# Altium schematic symbol library altera.SCHLIB: 68 symbols (part 4 of 6) (continued)
## EPF10K130V-P240 (continued)
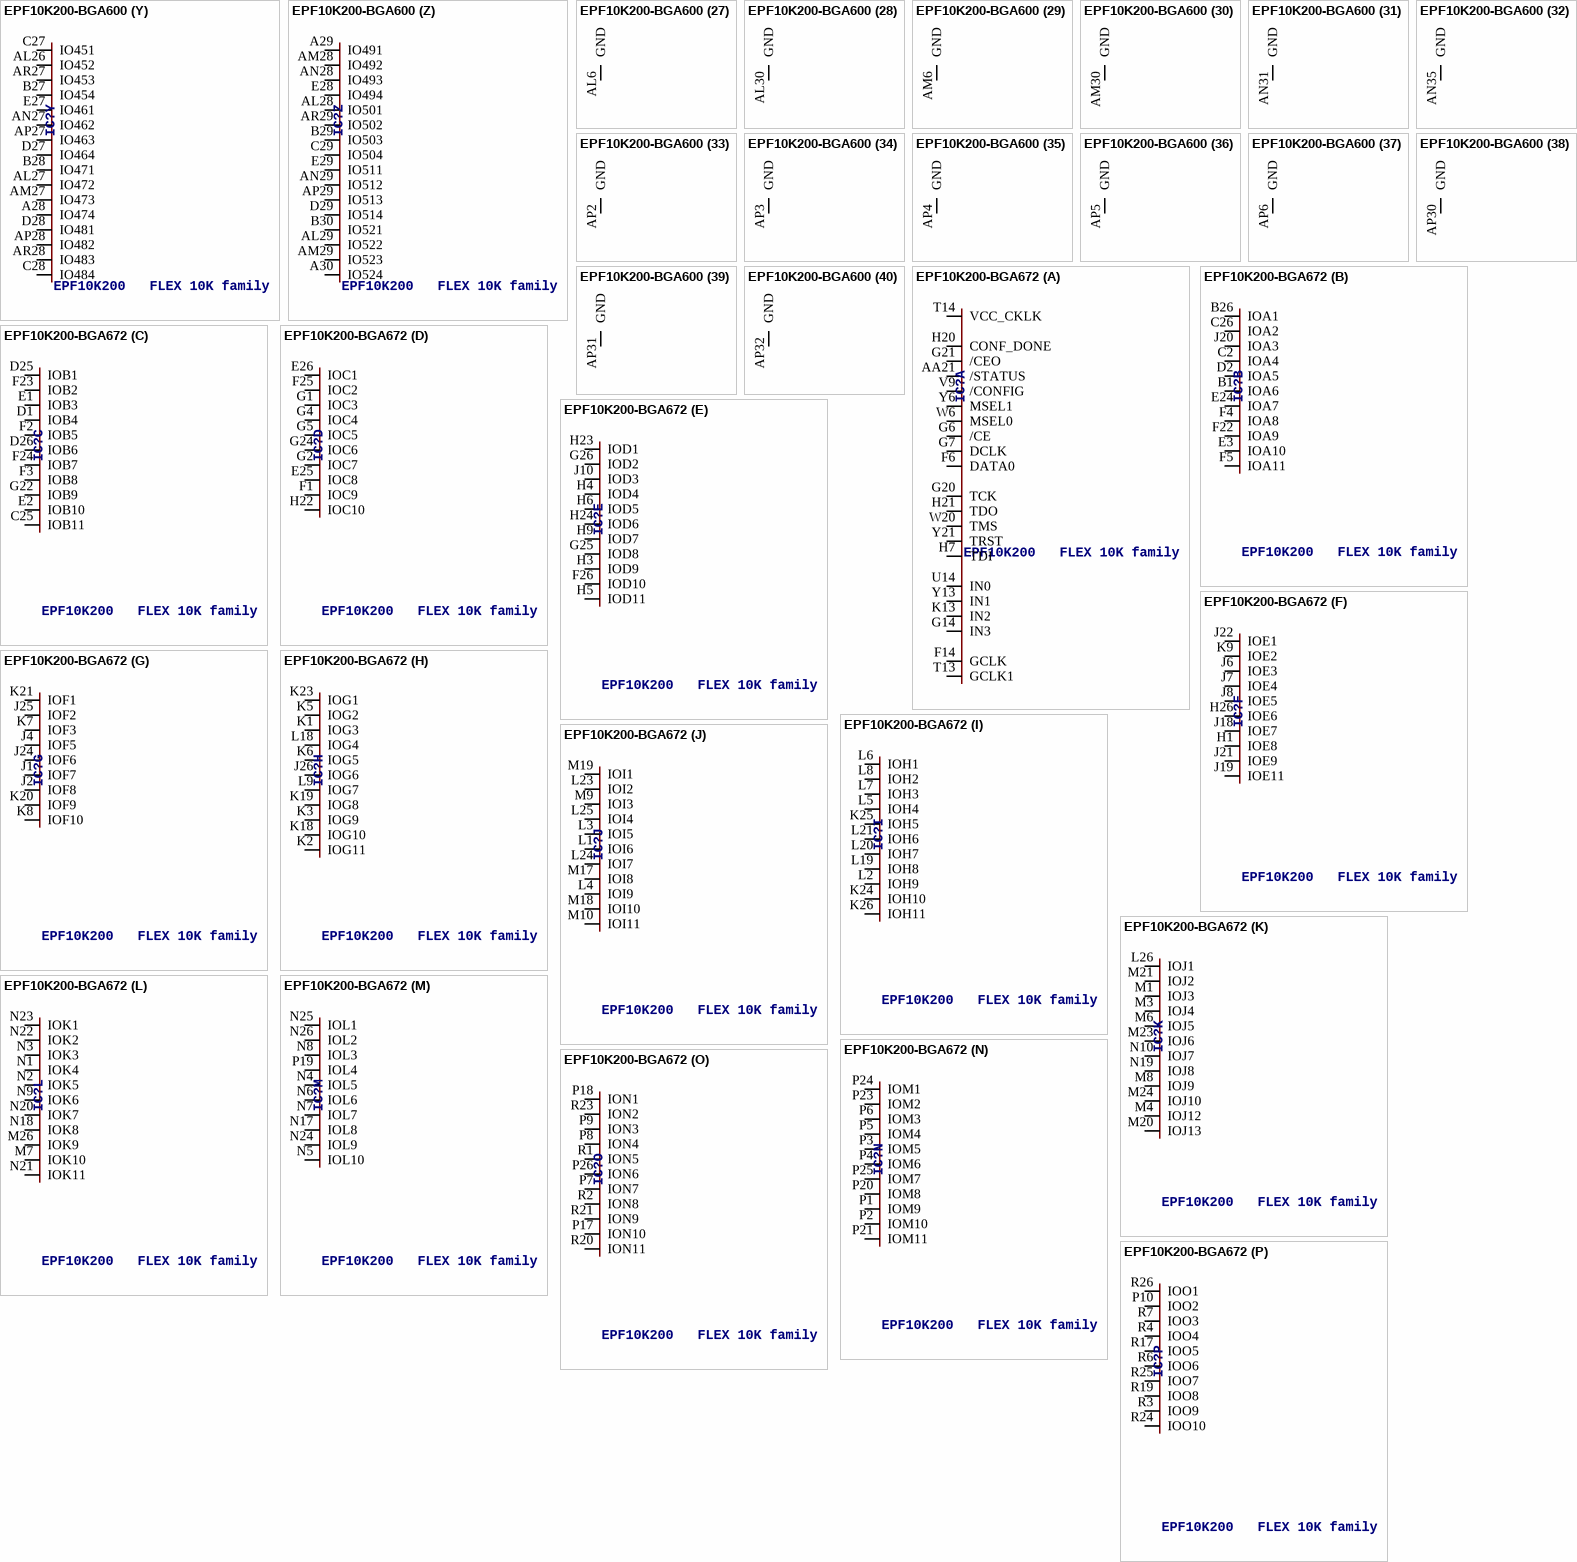
[diagram p30: symbols EPF10K200-BGA600 to EPF10K200-BGA672]

## EPF10K200-BGA600
designator IC?, comment EPF10K200   FLEX 10K family
MPN: EPF10K200EBC600-1; OC_FARNELL: unknown; OC_NEWARK: 51R8896
footprint BGA600
part A pins: AL18 GCLK, AL31 TCK, AM4 DATA0, AM18 IN3, AM32 CONF_DONE, AN1 TDI, AN2 /CE, AN18 IN2, AN34 TDO, AP1 DCLK, AP35 /CEO, C1 MSEL1, C18 IN1, C34 TRST, C35 TMS, D4 /CONFIG, D18 IN0, D32 /STATUS, E18 GCLK1, F5 MSEL0, P5 VCC_CKLK
part B pins: AJ4 IOB5, AJ5 IOA8, AJ31 IOA7, AJ32 IOB7, AK3 IOB10, AK4 IOB4, AK5 IOA4, AK32 IOB1, AK33 IOB9, AL1 IOB3, AL2 IOB8, AL4 IOA10, AL32 IOA1, AL33 IOB2, AL34 IOB11, AL35 IOB6, AM1 IOA5, AM2 IOA11, AM3 IOA6, AM33 IOA2, AM34 IOA3, AM35 IOA9
part C pins: AG4 IOD9, AG31 IOD10, AH1 IOD3, AH2 IOD4, AH3 IOD5, AH4 IOD11, AH5 IOC9, AH31 IOC8, AH32 IOD8, AH33 IOD6, AH34 IOD1, AH35 IOD2, AJ1 IOD7, AJ2 IOC3, AJ3 IOC5, AJ33 IOC2, AJ34 IOC6, AJ35 IOC10, AK1 IOC7, AK2 IOC4, AK34 IOC1
part D pins: AE3 IOF7, AE5 IOF3, AE31 IOF2, AE32 IOF4, AE33 IOF6, AF1 IOF8, AF2 IOF5, AF3 IOF10, AF4 IOE3, AF5 IOE4, AF31 IOE1, AF33 IOE7, AF34 IOF9, AF35 IOF1, AG1 IOE2, AG2 IOE5, AG3 IOE8, AG32 IOE6, AG33 IOE9, AG34 IOE11, AG35 IOE10
part E pins: AC2 IOH4, AC3 IOH9, AC4 IOH1, AC5 IOH2, AC31 IOH8, AC32 IOH10, AC33 IOH6, AC34 IOH11, AC35 IOH7, AD1 IOH3, AD2 IOG7, AD3 IOG3, AD4 IOG9, AD5 IOG2, AD31 IOG1, AD32 IOG8, AD33 IOG4, AD34 IOH5, AE1 IOG11, AE2 IOG5, AE34 IOG6, AE35 IOG10
part F pins: AA1 IOJ3, AA2 IOJ4, AA3 IOJ5, AA4 IOJ12, AA5 IOJ7, AA31 IOJ1, AA32 IOJ11, AA34 IOJ6, AA35 IOJ10, AB1 IOI6, AB2 IOI3, AB3 IOI9, AB4 IOI5, AB31 IOI10, AB32 IOI2, AB33 IOI7, AB34 IOI4, AB35 IOI8, AC1 IOI11, Y5 IOJ9, Y31 IOJ8
part G pins: V4 IOL3, V5 IOL6, V31 IOL2, V33 IOL4, W1 IOL5, W2 IOL7, W3 IOL10, W4 IOK3, W5 IOK4, W31 IOK9, W32 IOK8, W33 IOL9, W34 IOL8, W35 IOL1, Y1 IOK5, Y3 IOK10, Y4 IOK6, Y32 IOK11, Y33 IOK7, Y34 IOK1, Y35 IOK2
part H pins: T2 ION8, T3 ION5, T4 ION3, T5 ION4, T31 ION6, T32 ION2, T33 ION11, T34 ION9, U1 ION7, U2 IOM4, U4 IOM6, U5 IOM3, U31 IOM2, U32 IOM8, U33 IOM7, U34 ION10, U35 ION1, V1 IOM5, V2 IOM9, V3 IOM10, V34 IOM11, V35 IOM1
part I pins: N5 IOP4, P1 IOP7, P2 IOP2, P3 IOP3, P4 IOP6, P31 IOP10, P32 IOP1, P33 IOP11, P34 IOP5, P35 IOP8, R1 IOP9, R2 IOO6, R3 IOO2, R4 IOO3, R5 IOO4, R31 IOO8, R32 IOO1, R33 IOO7, R34 IOO10, R35 IOO5, T1 IOO9
part J pins: L1 IOR8, L2 IOR4, L34 IOR3, L35 IOR2, M1 IOQ6, M3 IOR5, M4 IOR9, M5 IOR7, M31 IOQ7, M32 IOR6, M33 IOR10, M34 IOR1, M35 IOQ4, N1 IOQ2, N2 IOQ3, N3 IOQ9, N4 IOQ8, N31 IOQ10, N32 IOQ11, N33 IOQ5, N35 IOQ1
part K pins: J1 IOT3, J2 IOT4, J3 IOT7, J32 IOT8, J33 IOT5, J34 IOT1, J35 IOT11, K1 IOS5, K2 IOS8, K3 IOS4, K4 IOT9, K5 IOT2, K31 IOT6, K33 IOT10, K34 IOS2, K35 IOS1, L3 IOS9, L4 IOS3, L5 IOS7, L31 IOS6, L32 IOS10, L33 IOS11
part L pins: F1 IOV3, F2 IOV7, F34 IOV2, G1 IOV9, G2 IOV11, G3 IOV4, G33 IOV1, G34 IOV6, G35 IOV10, H2 IOU4, H3 IOU3, H4 IOU5, H5 IOV5, H31 IOV8, H32 IOU9, H33 IOU1, H34 IOU10, H35 IOU6, J4 IOU7, J5 IOU8, J31 IOU2
part M pins: D1 IOX9, D2 IOX4, D3 IOX3, D33 IOX10, D34 IOX7, D35 IOX2, E1 IOW3, E3 IOW2, E4 IOX5, E32 IOX6, E33 IOW4, E34 IOW10, E35 IOW6, F3 IOW5, F4 IOW7, F32 IOW8, F33 IOW11, G4 IOW9, G5 IOX8, G31 IOX1, G32 IOW1
part N pins: A6 IO14, A7 IO31, AL7 IO13, AL8 IO42, AM7 IO22, AM8 IO43, AN7 IO23, AP7 IO32, AR6 IO12, AR7 IO33, B7 IO34, C7 IO21, D7 IO24, D8 IO41, E7 IO11, E8 IO44
part O pins: A8 IO51, A9 IO82, AL9 IO63, AL10 IO83, AM9 IO62, AN9 IO73, AP8 IO54, AP9 IO72, AR8 IO53, AR9 IO84, B8 IO52, B9 IO71, C9 IO74, D9 IO61, E9 IO64, E10 IO81
part P pins: A10 IO101, AL11 IO113, AM10 IO93, AM11 IO112, AN10 IO92, AN11 IO122, AP10 IO103, AP11 IO123, AR10 IO102, B10 IO104, B11 IO121, C10 IO91, C11 IO124, D10 IO94, D11 IO111, E11 IO114
part Q pins: A12 IO144, AL13 IO153, AM12 IO133, AM13 IO152, AN12 IO132, AN13 IO163, AP12 IO143, AP13 IO162, AR12 IO142, B12 IO141, B13 IO164, C12 IO134, C13 IO161, D12 IO131, D13 IO154, E13 IO151
part R pins: A13 IO174, A14 IO191, AL14 IO172, AL15 IO203, AM14 IO183, AM15 IO202, AN14 IO182, AP14 IO193, AR13 IO173, AR14 IO192, B14 IO194, C14 IO181, D14 IO184, D15 IO201, E14 IO171, E15 IO204
part S pins: A15 IO211, A16 IO244, AL16 IO222, AL17 IO243, AM16 IO223, AN16 IO232, AP15 IO212, AP16 IO233, AR15 IO213, AR16 IO242, B15 IO214, B16 IO231, C16 IO234, D16 IO221, E16 IO224, E17 IO241
part T pins: A17 IO263, AM17 IO251, AN17 IO252, AN19 IO284, AP17 IO261, AP18 IO273, AP19 IO283, AR17 IO262, AR19 IO272, B17 IO264, B19 IO274, C17 IO253, C19 IO271, D17 IO254, D19 IO282, E19 IO281
part U pins: A21 IO314, AL19 IO292, AL20 IO312, AM20 IO313, AN20 IO302, AP20 IO303, AP21 IO322, AR20 IO293, AR21 IO323, B20 IO294, B21 IO311, C20 IO291, C21 IO324, D20 IO304, D21 IO321, E20 IO301
part V pins: A22 IO331, A23 IO361, AL21 IO343, AL22 IO363, AM21 IO332, AM22 IO364, AN21 IO333, AN22 IO352, AP22 IO354, AR22 IO342, B22 IO344, B23 IO362, C22 IO341, D22 IO353, E21 IO334, E22 IO351
part W pins: A24 IO384, A25 IO391, AL23 IO382, AM23 IO383, AM24 IO403, AN23 IO371, AN24 IO393, AP23 IO372, AR24 IO392, AR25 IO401, B24 IO381, B25 IO404, C24 IO394, D23 IO374, E23 IO373, E24 IO402
part X pins: A26 IO421, AL24 IO412, AL25 IO433, AM25 IO422, AN25 IO423, AN26 IO442, AP25 IO413, AP26 IO443, AR26 IO432, B26 IO431, C25 IO411, C26 IO434, D25 IO414, D26 IO444, E25 IO424, E26 IO441
part Y pins: A28 IO474, AL26 IO452, AL27 IO472, AM27 IO473, AN27 IO462, AP27 IO463, AP28 IO482, AR27 IO453, AR28 IO483, B27 IO454, B28 IO471, C27 IO451, C28 IO484, D27 IO464, D28 IO481, E27 IO461
part Z pins: A29 IO491, A30 IO524, AL28 IO501, AL29 IO522, AM28 IO492, AM29 IO523, AN28 IO493, AN29 IO512, AP29 IO513, AR29 IO502, B29 IO503, B30 IO521, C29 IO504, D29 IO514, E28 IO494, E29 IO511
part 27 pins: AL6 GND (power)
part 28 pins: AL30 GND (power)
part 29 pins: AM6 GND (power)
part 30 pins: AM30 GND (power)
part 31 pins: AN31 GND (power)
part 32 pins: AN35 GND (power)
part 33 pins: AP2 GND (power)
part 34 pins: AP3 GND (power)
part 35 pins: AP4 GND (power)
part 36 pins: AP5 GND (power)
part 37 pins: AP6 GND (power)
part 38 pins: AP30 GND (power)
part 39 pins: AP31 GND (power)
part 40 pins: AP32 GND (power)
part 41 pins: AP33 GND (power)
part 42 pins: AR1 GND (power)
part 43 pins: AR2 GND (power)
part 44 pins: AR3 GND (power)
part 45 pins: AR4 GND (power)
part 46 pins: AR5 GND (power)
part 47 pins: AR30 GND (power)
part 48 pins: AR31 GND (power)
part 49 pins: AR32 GND (power)
part 50 pins: AR33 GND (power)
part 51 pins: AR34 GND (power)
part 52 pins: AR35 GND (power)
part 53 pins: A1 GND (power)
part 54 pins: A2 GND (power)
part 55 pins: A3 GND (power)
part 56 pins: A4 GND (power)
part 57 pins: A5 GND (power)
part 58 pins: A18 GND (power)
part 59 pins: A31 GND (power)
part 60 pins: A32 GND (power)
part 61 pins: A33 GND (power)
part 62 pins: A34 GND (power)
part 63 pins: A35 GND (power)
part 64 pins: B2 GND (power)
part 65 pins: B3 GND (power)
part 66 pins: B4 GND (power)
part 67 pins: B5 GND (power)
part 68 pins: B6 GND (power)
part 69 pins: B31 GND (power)
part 70 pins: B32 GND (power)
part 71 pins: B33 GND (power)
part 72 pins: B34 GND (power)
part 73 pins: B35 GND (power)
part 74 pins: C5 GND (power)
part 75 pins: C6 GND (power)
part 76 pins: C30 GND (power)
part 77 pins: C31 GND (power)
part 78 pins: D6 GND (power)
part 79 pins: D30 GND (power)
part 80 pins: E6 GND (power)
part 81 pins: E30 GND (power)
part 82 pins: AN5 GND (power)
part 83 pins: AN6 GND (power)
part 84 pins: AN30 GND (power)
part 85 pins: AA33 VCC (power)
part 86 pins: AB5 VCC (power)
part 87 pins: AD35 VCC (power)
part 88 pins: AE4 VCC (power)
part 89 pins: AF32 VCC (power)
part 90 pins: AG5 VCC (power)
part 91 pins: AK31 VCC (power)
part 92 pins: AK35 VCC (power)
part 93 pins: AL3 VCC (power)
part 94 pins: AP24 VCC (power)
part 95 pins: AR11 VCC (power)
part 96 pins: AR18 VCC (power)
part 97 pins: A11 VCC (power)
part 98 pins: A19 VCC (power)
part 99 pins: B1 VCC (power)
part 100 pins: B18 VCC (power)
part 101 pins: D24 VCC (power)
part 102 pins: E2 VCC (power)
part 103 pins: F31 VCC (power)
part 104 pins: F35 VCC (power)
part 105 pins: H1 VCC (power)
part 106 pins: K32 VCC (power)
part 107 pins: M2 VCC (power)
part 108 pins: N34 VCC (power)
part 109 pins: T35 VCC (power)
part 110 pins: U3 VCC (power)
part 111 pins: V32 VCC (power)
part 112 pins: Y2 VCC (power)
part 113 pins: AL5 VCCIO (power)
part 114 pins: AL12 VCCIO (power)
part 115 pins: AM5 VCCIO (power)
part 116 pins: AM19 VCCIO (power)
part 117 pins: AM26 VCCIO (power)
part 118 pins: AM31 VCCIO (power)
part 119 pins: AN3 VCCIO (power)
part 120 pins: AN4 VCCIO (power)
part 121 pins: AN8 VCCIO (power)
part 122 pins: AN15 VCCIO (power)
part 123 pins: AN32 VCCIO (power)
part 124 pins: AN33 VCCIO (power)
part 125 pins: AP34 VCCIO (power)
part 126 pins: AR23 VCCIO (power)
part 127 pins: A20 VCCIO (power)
part 128 pins: A27 VCCIO (power)
part 129 pins: C2 VCCIO (power)
part 130 pins: C3 VCCIO (power)
part 131 pins: C4 VCCIO (power)
part 132 pins: C8 VCCIO (power)
part 133 pins: C15 VCCIO (power)
part 134 pins: C23 VCCIO (power)
part 135 pins: C32 VCCIO (power)
part 136 pins: C33 VCCIO (power)
part 137 pins: D5 VCCIO (power)
part 138 pins: D31 VCCIO (power)
part 139 pins: E5 VCCIO (power)
part 140 pins: E12 VCCIO (power)
part 141 pins: E31 VCCIO (power)

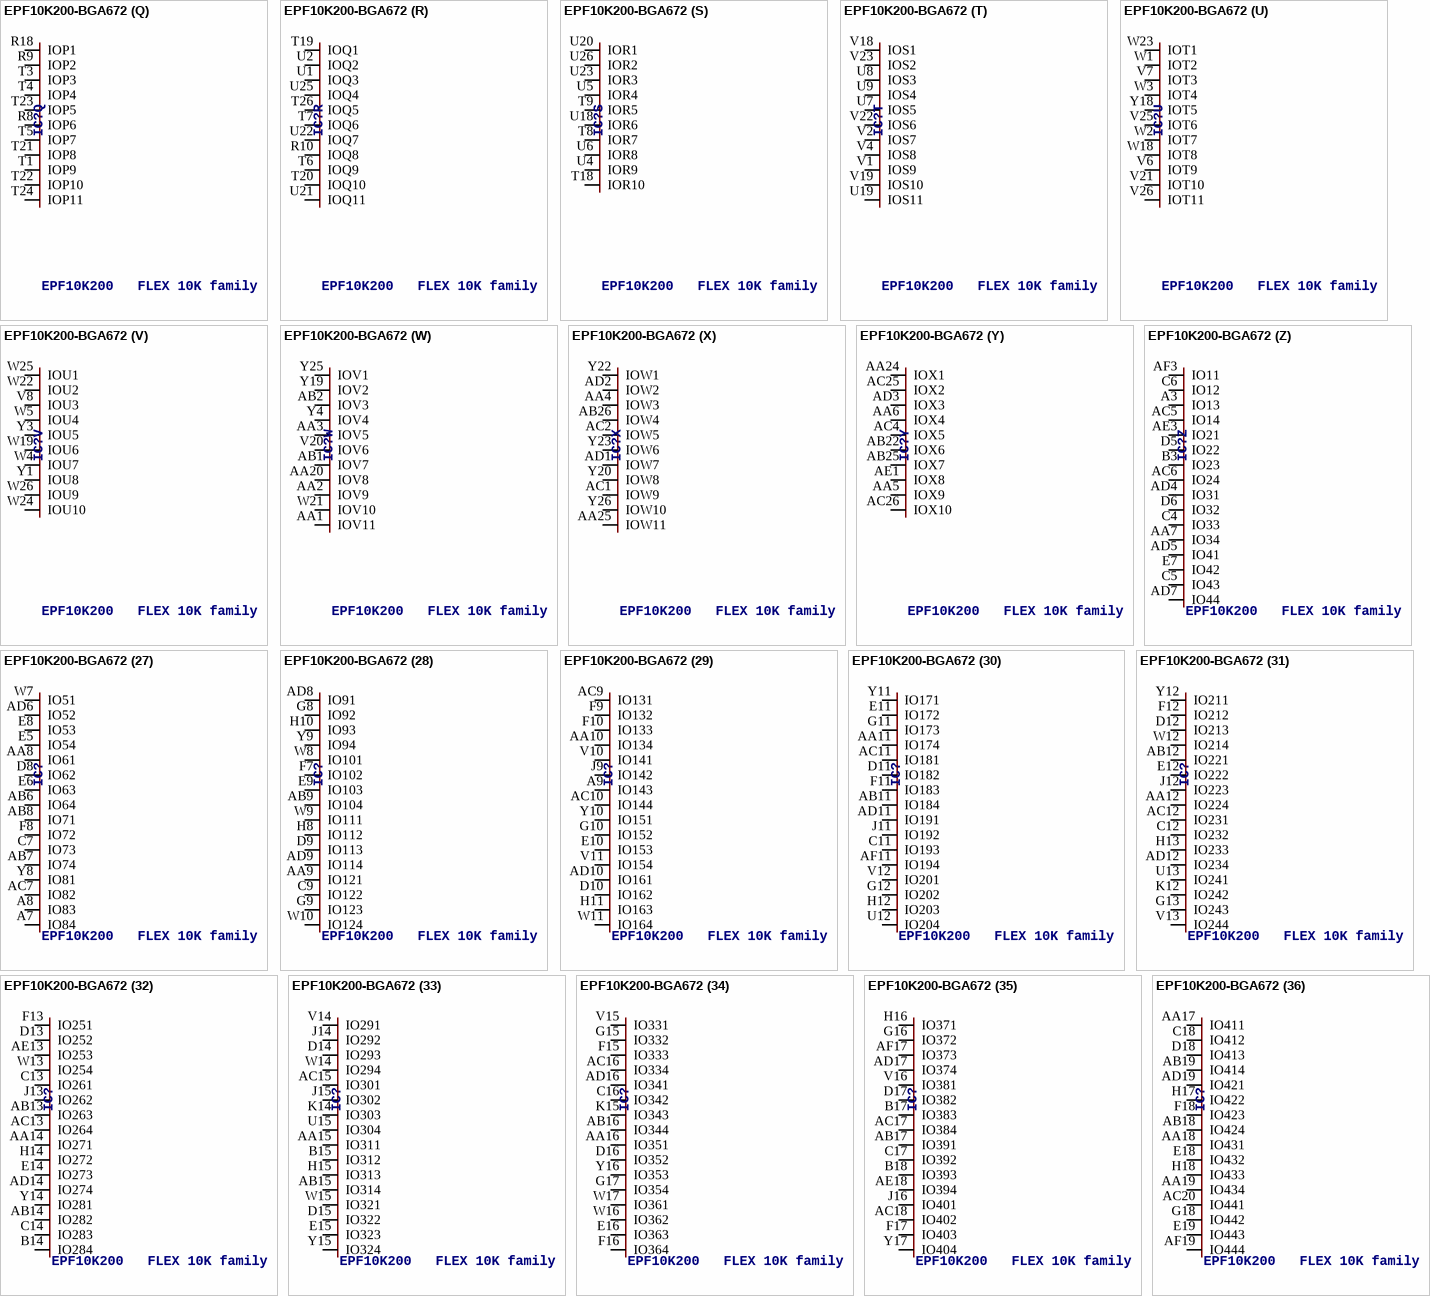
[diagram p31: symbol EPF10K200-BGA672]

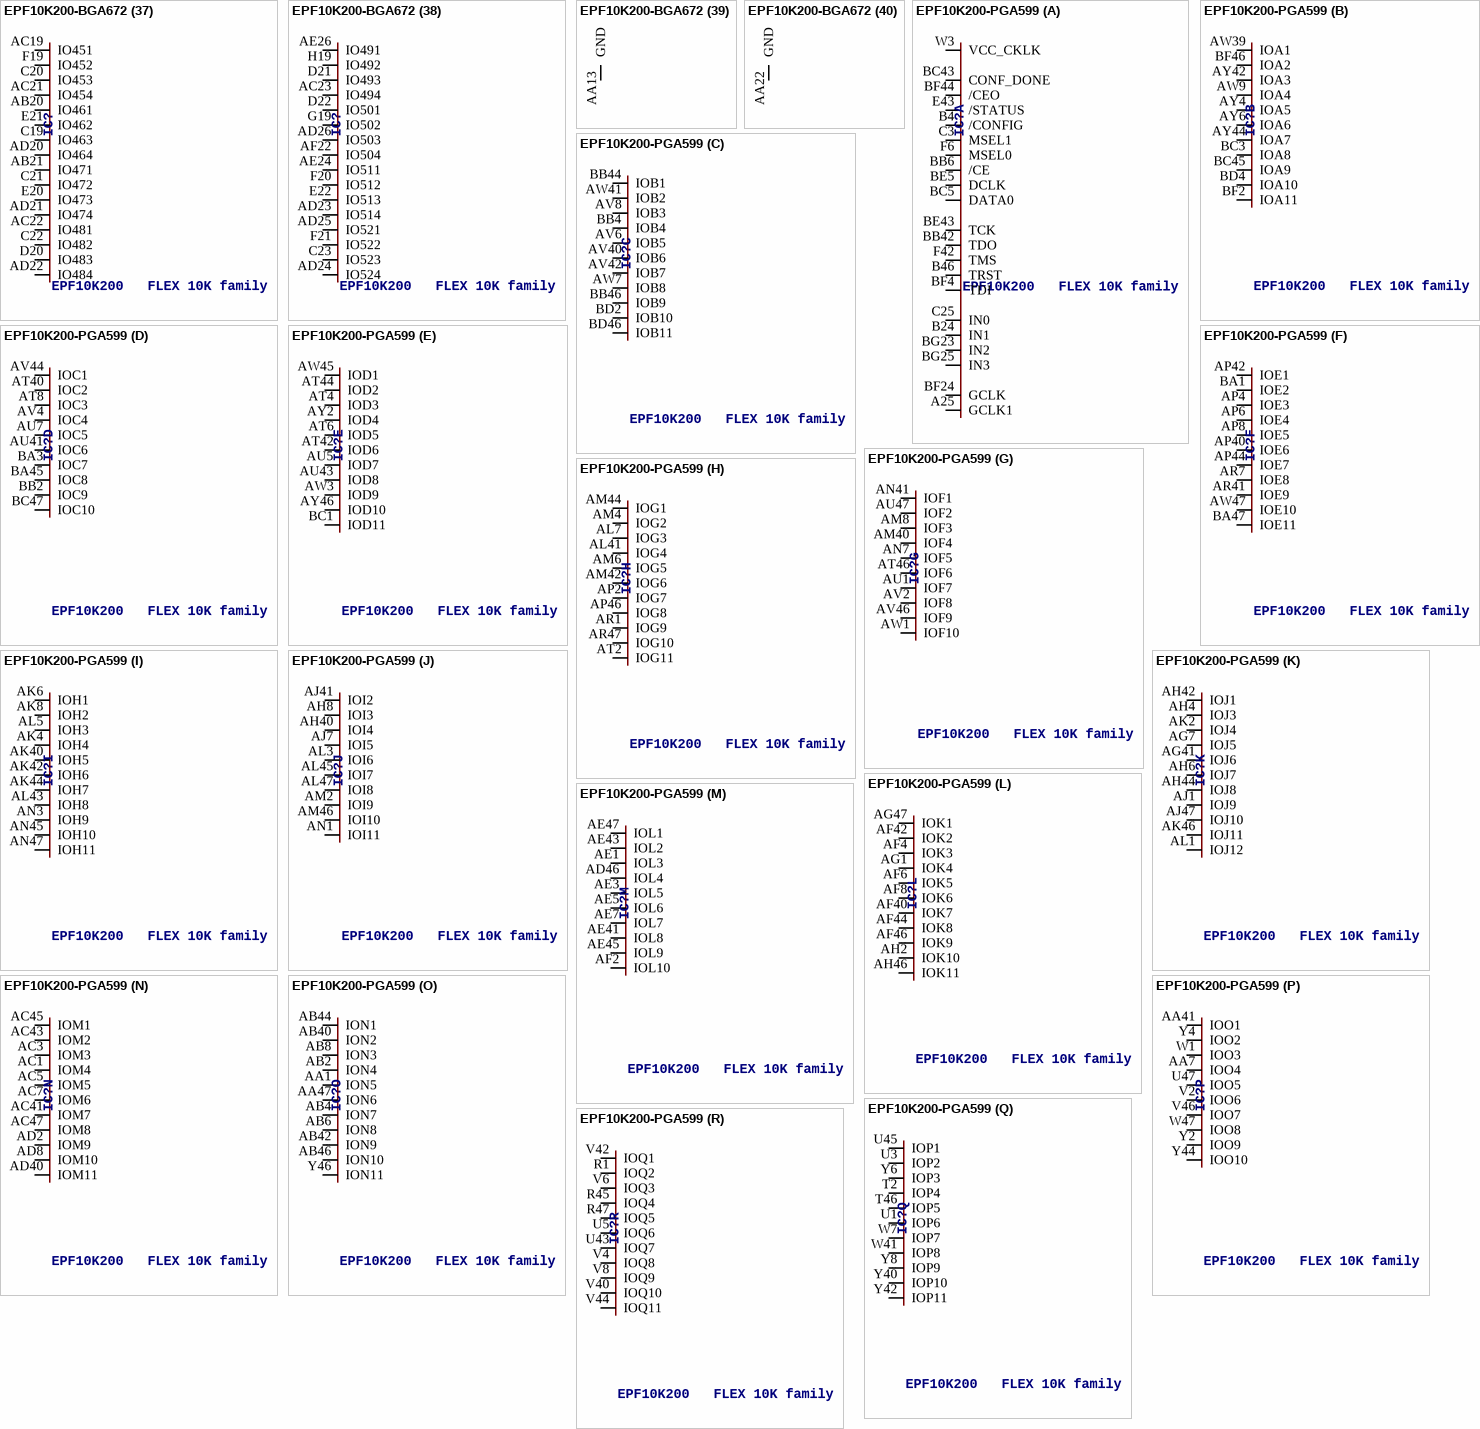
[diagram p32: symbols EPF10K200-BGA672 to EPF10K200-PGA599]

## EPF10K200-BGA672
designator IC?, comment EPF10K200   FLEX 10K family
MPN: EPF10K200EFC672-1; OC_FARNELL: unknown; OC_NEWARK: 51R8900
footprint BGA672
part A pins: AA21 /STATUS, F6 DATA0, F14 GCLK, G6 /CE, G7 DCLK, G14 IN3, G20 TCK, G21 /CEO, H7 TDI, H20 CONF_DONE, H21 TDO, K13 IN2, T13 GCLK1, T14 VCC_CKLK, U14 IN0, V9 /CONFIG, W6 MSEL0, W20 TMS, Y6 MSEL1, Y13 IN1, Y21 TRST
part B pins: B1 IOA6, B26 IOA1, C2 IOA4, C26 IOA2, D2 IOA5, E3 IOA10, E24 IOA7, F4 IOA8, F5 IOA11, F22 IOA9, J20 IOA3
part C pins: C25 IOB11, D1 IOB4, D25 IOB1, D26 IOB6, E1 IOB3, E2 IOB10, F2 IOB5, F3 IOB8, F23 IOB2, F24 IOB7, G22 IOB9
part D pins: E25 IOC8, E26 IOC1, F1 IOC9, F25 IOC2, G1 IOC3, G2 IOC7, G4 IOC4, G5 IOC5, G24 IOC6, H22 IOC10
part E pins: F26 IOD10, G25 IOD8, G26 IOD2, H3 IOD9, H4 IOD4, H5 IOD11, H6 IOD5, H9 IOD7, H23 IOD1, H24 IOD6, J10 IOD3
part F pins: H1 IOE8, H26 IOE6, J6 IOE3, J7 IOE4, J8 IOE5, J18 IOE7, J19 IOE11, J21 IOE9, J22 IOE1, K9 IOE2
part G pins: J1 IOF7, J2 IOF8, J4 IOF5, J24 IOF6, J25 IOF2, K7 IOF3, K8 IOF10, K20 IOF9, K21 IOF1
part H pins: J26 IOG6, K1 IOG3, K2 IOG11, K3 IOG9, K5 IOG2, K6 IOG5, K18 IOG10, K19 IOG8, K23 IOG1, L9 IOG7, L18 IOG4
part I pins: K24 IOH10, K25 IOH5, K26 IOH11, L2 IOH9, L5 IOH4, L6 IOH1, L7 IOH3, L8 IOH2, L19 IOH8, L20 IOH7, L21 IOH6
part J pins: L1 IOI6, L3 IOI5, L4 IOI9, L23 IOI2, L24 IOI7, L25 IOI4, M9 IOI3, M10 IOI11, M17 IOI8, M18 IOI10, M19 IOI1
part K pins: L26 IOJ1, M1 IOJ3, M3 IOJ4, M4 IOJ12, M6 IOJ5, M8 IOJ9, M20 IOJ13, M21 IOJ2, M23 IOJ6, M24 IOJ10, N10 IOJ7, N19 IOJ8
part L pins: M7 IOK10, M26 IOK9, N1 IOK4, N2 IOK5, N3 IOK3, N9 IOK6, N18 IOK8, N20 IOK7, N21 IOK11, N22 IOK2, N23 IOK1
part M pins: N4 IOL5, N5 IOL10, N6 IOL6, N7 IOL7, N8 IOL3, N17 IOL8, N24 IOL9, N25 IOL1, N26 IOL2, P19 IOL4
part N pins: P1 IOM9, P2 IOM10, P3 IOM5, P4 IOM6, P5 IOM4, P6 IOM3, P20 IOM8, P21 IOM11, P23 IOM2, P24 IOM1, P25 IOM7
part O pins: P7 ION7, P8 ION4, P9 ION3, P17 ION10, P18 ION1, P26 ION6, R1 ION5, R2 ION8, R20 ION11, R21 ION9, R23 ION2
part P pins: P10 IOO2, R3 IOO9, R4 IOO4, R6 IOO6, R7 IOO3, R17 IOO5, R19 IOO8, R24 IOO10, R25 IOO7, R26 IOO1
part Q pins: R8 IOP6, R9 IOP2, R18 IOP1, T1 IOP9, T3 IOP3, T4 IOP4, T5 IOP7, T21 IOP8, T22 IOP10, T23 IOP5, T24 IOP11
part R pins: R10 IOQ8, T6 IOQ9, T7 IOQ6, T19 IOQ1, T20 IOQ10, T26 IOQ5, U1 IOQ3, U2 IOQ2, U21 IOQ11, U22 IOQ7, U25 IOQ4
part S pins: T8 IOR7, T9 IOR5, T18 IOR10, U4 IOR9, U5 IOR4, U6 IOR8, U18 IOR6, U20 IOR1, U23 IOR3, U26 IOR2
part T pins: U7 IOS5, U8 IOS3, U9 IOS4, U19 IOS11, V1 IOS9, V2 IOS7, V4 IOS8, V18 IOS1, V19 IOS10, V22 IOS6, V23 IOS2
part U pins: V6 IOT9, V7 IOT3, V21 IOT10, V25 IOT6, V26 IOT11, W1 IOT2, W2 IOT7, W3 IOT4, W18 IOT8, W23 IOT1, Y18 IOT5
part V pins: V8 IOU3, W4 IOU7, W5 IOU4, W19 IOU6, W22 IOU2, W24 IOU10, W25 IOU1, W26 IOU9, Y1 IOU8, Y3 IOU5
part W pins: AA1 IOV11, AA2 IOV9, AA3 IOV5, AA20 IOV8, AB1 IOV7, AB2 IOV3, V20 IOV6, W21 IOV10, Y4 IOV4, Y19 IOV2, Y25 IOV1
part X pins: AA4 IOW3, AA25 IOW11, AB26 IOW4, AC1 IOW9, AC2 IOW5, AD1 IOW7, AD2 IOW2, Y20 IOW8, Y22 IOW1, Y23 IOW6, Y26 IOW10
part Y pins: AA5 IOX9, AA6 IOX4, AA24 IOX1, AB22 IOX6, AB25 IOX7, AC4 IOX5, AC25 IOX2, AC26 IOX10, AD3 IOX3, AE1 IOX8
part Z pins: A3 IO13, AA7 IO34, AC5 IO14, AC6 IO24, AD4 IO31, AD5 IO41, AD7 IO44, AE3 IO21, AF3 IO11, B3 IO23, C4 IO33, C5 IO43, C6 IO12, D5 IO22, D6 IO32, E7 IO42
part 27 pins: A7 IO84, A8 IO83, AA8 IO61, AB6 IO64, AB7 IO74, AB8 IO71, AC7 IO82, AD6 IO52, C7 IO73, D8 IO62, E5 IO54, E6 IO63, E8 IO53, F8 IO72, W7 IO51, Y8 IO81
part 28 pins: AA9 IO121, AB9 IO104, AD8 IO91, AD9 IO114, C9 IO122, D9 IO113, E9 IO103, F7 IO102, G8 IO92, G9 IO123, H8 IO112, H10 IO93, W8 IO101, W9 IO111, W10 IO124, Y9 IO94
part 29 pins: A9 IO143, AA10 IO134, AC9 IO131, AC10 IO144, AD10 IO161, D10 IO162, E10 IO153, F9 IO132, F10 IO133, G10 IO152, H11 IO163, J9 IO142, V10 IO141, V11 IO154, W11 IO164, Y10 IO151
part 30 pins: AA11 IO174, AB11 IO184, AC11 IO181, AD11 IO191, AF11 IO194, C11 IO193, D11 IO182, E11 IO172, F11 IO183, G11 IO173, G12 IO202, H12 IO203, J11 IO192, U12 IO204, V12 IO201, Y11 IO171
part 31 pins: AA12 IO224, AB12 IO221, AC12 IO231, AD12 IO234, C12 IO232, D12 IO213, E12 IO222, F12 IO212, G13 IO243, H13 IO233, J12 IO223, K12 IO242, U13 IO241, V13 IO244, W12 IO214, Y12 IO211
part 32 pins: AA14 IO271, AB13 IO263, AB14 IO282, AC13 IO264, AD14 IO274, AE13 IO253, B14 IO284, C13 IO261, C14 IO283, D13 IO252, E14 IO273, F13 IO251, H14 IO272, J13 IO262, W13 IO254, Y14 IO281
part 33 pins: AA15 IO311, AB15 IO314, AC15 IO301, B15 IO312, D14 IO293, D15 IO322, E15 IO323, H15 IO313, J14 IO292, J15 IO302, K14 IO303, U15 IO304, V14 IO291, W14 IO294, W15 IO321, Y15 IO324
part 34 pins: AA16 IO351, AB16 IO344, AC16 IO334, AD16 IO341, C16 IO342, D16 IO352, E16 IO363, F15 IO333, F16 IO364, G15 IO332, G17 IO354, K15 IO343, V15 IO331, W16 IO362, W17 IO361, Y16 IO353
part 35 pins: AB17 IO391, AC17 IO384, AC18 IO402, AD17 IO374, AE18 IO394, AF17 IO373, B17 IO383, B18 IO393, C17 IO392, D17 IO382, F17 IO403, G16 IO372, H16 IO371, J16 IO401, V16 IO381, Y17 IO404
part 36 pins: AA17 IO411, AA18 IO431, AA19 IO434, AB18 IO424, AB19 IO414, AC20 IO441, AD19 IO421, AF19 IO444, C18 IO412, D18 IO413, E18 IO432, E19 IO443, F18 IO423, G18 IO442, H17 IO422, H18 IO433
part 37 pins: AB20 IO461, AB21 IO471, AC19 IO451, AC21 IO454, AC22 IO481, AD20 IO464, AD21 IO474, AD22 IO484, C19 IO463, C20 IO453, C21 IO472, C22 IO482, D20 IO483, E20 IO473, E21 IO462, F19 IO452
part 38 pins: AC23 IO494, AD23 IO514, AD24 IO524, AD25 IO521, AD26 IO503, AE24 IO511, AE26 IO491, AF22 IO504, C23 IO523, D21 IO493, D22 IO501, E22 IO513, F20 IO512, F21 IO522, G19 IO502, H19 IO492
part 39 pins: AA13 GND (power)
part 40 pins: AA22 GND (power)
part 41 pins: AB3 GND (power)
part 42 pins: AB4 GND (power)
part 43 pins: AB5 GND (power)
part 44 pins: AB23 GND (power)
part 45 pins: AB24 GND (power)
part 46 pins: AC3 GND (power)
part 47 pins: AC8 GND (power)
part 48 pins: AC24 GND (power)
part 49 pins: AD13 GND (power)
part 50 pins: AD18 GND (power)
part 51 pins: AE2 GND (power)
part 52 pins: AE25 GND (power)
part 53 pins: AF2 GND (power)
part 54 pins: AF25 GND (power)
part 55 pins: A2 GND (power)
part 56 pins: A25 GND (power)
part 57 pins: B2 GND (power)
part 58 pins: B25 GND (power)
part 59 pins: C3 GND (power)
part 60 pins: C10 GND (power)
part 61 pins: C24 GND (power)
part 62 pins: D3 GND (power)
part 63 pins: D4 GND (power)
part 64 pins: D19 GND (power)
part 65 pins: D23 GND (power)
part 66 pins: D24 GND (power)
part 67 pins: E4 GND (power)
part 68 pins: E23 GND (power)
part 69 pins: G23 GND (power)
part 70 pins: J5 GND (power)
part 71 pins: J23 GND (power)
part 72 pins: K4 GND (power)
part 73 pins: K10 GND (power)
part 74 pins: K17 GND (power)
part 75 pins: L11 GND (power)
part 76 pins: L16 GND (power)
part 77 pins: L22 GND (power)
part 78 pins: M5 GND (power)
part 79 pins: M12 GND (power)
part 80 pins: M14 GND (power)
part 81 pins: M15 GND (power)
part 82 pins: N13 GND (power)
part 83 pins: N14 GND (power)
part 84 pins: P13 GND (power)
part 85 pins: P14 GND (power)
part 86 pins: P22 GND (power)
part 87 pins: R12 GND (power)
part 88 pins: R15 GND (power)
part 89 pins: T11 GND (power)
part 90 pins: T16 GND (power)
part 91 pins: U10 GND (power)
part 92 pins: U17 GND (power)
part 93 pins: U24 GND (power)
part 94 pins: V3 GND (power)
part 95 pins: Y5 GND (power)
part 96 pins: AE4 NC
part 97 pins: AE5 NC
part 98 pins: AE6 NC
part 99 pins: AE7 NC
part 100 pins: AE8 NC
part 101 pins: AE9 NC
part 102 pins: AE10 NC
part 103 pins: AE11 NC
part 104 pins: AE12 NC
part 105 pins: AE14 NC
part 106 pins: AE15 NC
part 107 pins: AE16 NC
part 108 pins: AE17 NC
part 109 pins: AE19 NC
part 110 pins: AE20 NC
part 111 pins: AE21 NC
part 112 pins: AE22 NC
part 113 pins: AE23 NC
part 114 pins: AF4 NC
part 115 pins: AF5 NC
part 116 pins: AF6 NC
part 117 pins: AF7 NC
part 118 pins: AF8 NC
part 119 pins: AF9 NC
part 120 pins: AF10 NC
part 121 pins: AF12 NC
part 122 pins: AF13 NC
part 123 pins: AF14 NC
part 124 pins: AF15 NC
part 125 pins: AF16 NC
part 126 pins: AF18 NC
part 127 pins: AF20 NC
part 128 pins: AF21 NC
part 129 pins: AF23 NC
part 130 pins: AF24 NC
part 131 pins: A4 NC
part 132 pins: A5 NC
part 133 pins: A6 NC
part 134 pins: A10 NC
part 135 pins: A11 NC
part 136 pins: A12 NC
part 137 pins: A13 NC
part 138 pins: A14 NC
part 139 pins: A15 NC
part 140 pins: A16 NC
part 141 pins: A17 NC
part 142 pins: A18 NC
part 143 pins: A19 NC
part 144 pins: A20 NC
part 145 pins: A21 NC
part 146 pins: A22 NC
part 147 pins: A23 NC
part 148 pins: A24 NC
part 149 pins: B4 NC
part 150 pins: B5 NC
part 151 pins: B6 NC
part 152 pins: B7 NC
part 153 pins: B8 NC
part 154 pins: B9 NC
part 155 pins: B10 NC
part 156 pins: B11 NC
part 157 pins: B12 NC
part 158 pins: B13 NC
part 159 pins: B16 NC
part 160 pins: B19 NC
part 161 pins: B20 NC
part 162 pins: B21 NC
part 163 pins: B22 NC
part 164 pins: B23 NC
part 165 pins: B24 NC
part 166 pins: C1 NC
part 167 pins: AA23 VCC (power)
part 168 pins: AB10 VCC (power)
part 169 pins: AC14 VCC (power)
part 170 pins: E13 VCC (power)
part 171 pins: E17 VCC (power)
part 172 pins: H2 VCC (power)
part 173 pins: H25 VCC (power)
part 174 pins: K16 VCC (power)
part 175 pins: L10 VCC (power)
part 176 pins: L12 VCC (power)
part 177 pins: L14 VCC (power)